# Altium schematic symbol library jlcpcb_2025_04_capacitors_extended_0805.schlib: 3281 symbols (part 15 of 18) (continued)
## GRM21BC71C106KE11L
designator C?  Capacitance: 10uF  (hidden comment: *)
Capacitor, Ceramic (MLCC), 10uF, ±10%, 16V, X7S, ±10%, SMD 0805; Manufacturer: Murata Electronics; Manufacturer Part Number: GRM21BC71C106KE11L; Package Size: 0805; JLCPCB Basic Part: No; JLCPCB Part Number: C162319; Supplier 1: LCSC; Category: Capacitors - MLCC; Supplier Part Number 1: C162319; Tolerance: ±10%; Voltage Rating: 16V; Temperature Coefficient: X7S; RoHS: Yes; ComponentLink1Description: Datasheet; ComponentLink1URL: https://wmsc.lcsc.com/wmsc/upload/file/pdf/v2/lcsc/1810201241_Murata-Electronics-GRM21BC71C106KE11L_C162319.pdf; ComponentLink2Description: JLCPCB Part URL; ComponentLink2URL: https://jlcpcb.com/partdetail/C162319; ComponentLink3Description: LCSC Part URL; ComponentLink3URL: https://lcsc.com/product-detail/Multilayer-Ceramic-Capacitors-MLCC---SMD-SMT_Murata-Electronics-Murata-Electronics-GRM21BC71C106KE11L_C162319.html
footprint CAP-0805 (0805 (2012M) Capacitor)
pins: 1, 2

## GRM21BC71C106ME11L
designator C?  Capacitance: 10uF  (hidden comment: *)
Capacitor, Ceramic (MLCC), 10uF, ±20%, 16V, X7S, ±20%, SMD 0805; Manufacturer: Murata Electronics; Manufacturer Part Number: GRM21BC71C106ME11L; Package Size: 0805; JLCPCB Basic Part: No; JLCPCB Part Number: C710984; Supplier 1: LCSC; Category: Capacitors - MLCC; Supplier Part Number 1: C710984; Tolerance: ±20%; Voltage Rating: 16V; Temperature Coefficient: X7S; RoHS: Yes; ComponentLink1Description: Datasheet; ComponentLink1URL: https://wmsc.lcsc.com/wmsc/upload/file/pdf/v2/lcsc/2210190600_Murata-Electronics-GRM21BC71C106ME11L_C710984.pdf; ComponentLink2Description: JLCPCB Part URL; ComponentLink2URL: https://jlcpcb.com/partdetail/C710984; ComponentLink3Description: LCSC Part URL; ComponentLink3URL: https://lcsc.com/product-detail/Multilayer-Ceramic-Capacitors-MLCC---SMD-SMT_Murata-Electronics-Murata-Electronics-GRM21BC71C106ME11L_C710984.html
footprint CAP-0805 (0805 (2012M) Capacitor)
pins: 1, 2

## GRM21BC71E106KE11L
designator C?  Capacitance: 10uF  (hidden comment: *)
Capacitor, Ceramic (MLCC), 10uF, ±10%, 25V, X7S, ±10%, SMD 0805; Manufacturer: Murata Electronics; Manufacturer Part Number: GRM21BC71E106KE11L; Package Size: 0805; JLCPCB Basic Part: No; JLCPCB Part Number: C109040; Supplier 1: LCSC; Category: Capacitors - MLCC; Supplier Part Number 1: C109040; Tolerance: ±10%; Voltage Rating: 25V; Temperature Coefficient: X7S; RoHS: Yes; ComponentLink1Description: Datasheet; ComponentLink1URL: https://wmsc.lcsc.com/wmsc/upload/file/pdf/v2/lcsc/1912111437_Murata-Electronics-GRM21BC71E106KE11L_C109040.pdf; ComponentLink2Description: JLCPCB Part URL; ComponentLink2URL: https://jlcpcb.com/partdetail/C109040; ComponentLink3Description: LCSC Part URL; ComponentLink3URL: https://lcsc.com/product-detail/Multilayer-Ceramic-Capacitors-MLCC---SMD-SMT_Murata-Electronics-Murata-Electronics-GRM21BC71E106KE11L_C109040.html
footprint CAP-0805 (0805 (2012M) Capacitor)
pins: 1, 2

## GRM21BC71E475KE11L
designator C?  Capacitance: 4.7uF  (hidden comment: *)
Capacitor, Ceramic (MLCC), 4.7uF, ±10%, 25V, X7S, ±10%, SMD 0805; Manufacturer: Murata Electronics; Manufacturer Part Number: GRM21BC71E475KE11L; Package Size: 0805; JLCPCB Basic Part: No; JLCPCB Part Number: C385038; Supplier 1: LCSC; Category: Capacitors - MLCC; Supplier Part Number 1: C385038; Tolerance: ±10%; Voltage Rating: 25V; Temperature Coefficient: X7S; RoHS: Yes; ComponentLink1Description: Datasheet; ComponentLink1URL: https://wmsc.lcsc.com/wmsc/upload/file/pdf/v2/lcsc/2007231102_Murata-Electronics-GRM21BC71E475KE11L_C385038.pdf; ComponentLink2Description: JLCPCB Part URL; ComponentLink2URL: https://jlcpcb.com/partdetail/C385038; ComponentLink3Description: LCSC Part URL; ComponentLink3URL: https://lcsc.com/product-detail/Multilayer-Ceramic-Capacitors-MLCC---SMD-SMT_Murata-Electronics-Murata-Electronics-GRM21BC71E475KE11L_C385038.html
footprint CAP-0805 (0805 (2012M) Capacitor)
pins: 1, 2

## GRM21BC71H475KE11L
designator C?  Capacitance: 4.7uF  (hidden comment: *)
Capacitor, Ceramic (MLCC), 4.7uF, ±10%, 50V, X7S, ±10%, SMD 0805; Manufacturer: Murata Electronics; Manufacturer Part Number: GRM21BC71H475KE11L; Package Size: 0805; JLCPCB Basic Part: No; JLCPCB Part Number: C162320; Supplier 1: LCSC; Category: Capacitors - MLCC; Supplier Part Number 1: C162320; Tolerance: ±10%; Voltage Rating: 50V; Temperature Coefficient: X7S; RoHS: Yes; ComponentLink1Description: Datasheet; ComponentLink1URL: https://wmsc.lcsc.com/wmsc/upload/file/pdf/v2/lcsc/1810221842_Murata-Electronics-GRM21BC71H475KE11L_C162320.pdf; ComponentLink2Description: JLCPCB Part URL; ComponentLink2URL: https://jlcpcb.com/partdetail/C162320; ComponentLink3Description: LCSC Part URL; ComponentLink3URL: https://lcsc.com/product-detail/Multilayer-Ceramic-Capacitors-MLCC---SMD-SMT_Murata-Electronics-Murata-Electronics-GRM21BC71H475KE11L_C162320.html
footprint CAP-0805 (0805 (2012M) Capacitor)
pins: 1, 2

## GRM21BC72A105KE01L
designator C?  Capacitance: 1uF  (hidden comment: *)
Capacitor, Ceramic (MLCC), 1uF, ±10%, 100V, X7S, ±10%, SMD 0805; Manufacturer: Murata Electronics; Manufacturer Part Number: GRM21BC72A105KE01L; Package Size: 0805; JLCPCB Basic Part: No; JLCPCB Part Number: C385039; Supplier 1: LCSC; Category: Capacitors - MLCC; Supplier Part Number 1: C385039; Tolerance: ±10%; Voltage Rating: 100V; Temperature Coefficient: X7S; RoHS: Yes; ComponentLink1Description: Datasheet; ComponentLink1URL: https://wmsc.lcsc.com/wmsc/upload/file/pdf/v2/lcsc/2304140030_Murata-Electronics-GRM21BC72A105KE01L_C385039.pdf; ComponentLink2Description: JLCPCB Part URL; ComponentLink2URL: https://jlcpcb.com/partdetail/C385039; ComponentLink3Description: LCSC Part URL; ComponentLink3URL: https://lcsc.com/product-detail/Multilayer-Ceramic-Capacitors-MLCC---SMD-SMT_Murata-Electronics-Murata-Electronics-GRM21BC72A105KE01L_C385039.html
footprint CAP-0805 (0805 (2012M) Capacitor)
pins: 1, 2

## GRM21BC80E107ME15L
designator C?  Capacitance: 100uF  (hidden comment: *)
Capacitor, Ceramic (MLCC), 100uF, ±20%, 2.5V, X6S, ±20%, SMD 0805; Manufacturer: Murata Electronics; Manufacturer Part Number: GRM21BC80E107ME15L; Package Size: 0805; JLCPCB Basic Part: No; JLCPCB Part Number: C2167924; Supplier 1: LCSC; Category: Capacitors - MLCC; Supplier Part Number 1: C2167924; Tolerance: ±20%; Voltage Rating: 2.5V; Temperature Coefficient: X6S; RoHS: Yes; ComponentLink1Description: Datasheet; ComponentLink1URL: https://wmsc.lcsc.com/wmsc/upload/file/pdf/v2/lcsc/2202040300_Murata-Electronics-GRM21BC80E107ME15L_C2167924.pdf; ComponentLink2Description: JLCPCB Part URL; ComponentLink2URL: https://jlcpcb.com/partdetail/C2167924; ComponentLink3Description: LCSC Part URL; ComponentLink3URL: https://lcsc.com/product-detail/Multilayer-Ceramic-Capacitors-MLCC---SMD-SMT_Murata-Electronics-Murata-Electronics-GRM21BC80E107ME15L_C2167924.html
footprint CAP-0805 (0805 (2012M) Capacitor)
pins: 1, 2

## GRM21BC80G107ME15L
designator C?  Capacitance: 100uF  (hidden comment: *)
Capacitor, Ceramic (MLCC), 100uF, ±20%, 4V, X6S, ±20%, SMD 0805; Manufacturer: Murata Electronics; Manufacturer Part Number: GRM21BC80G107ME15L; Package Size: 0805; JLCPCB Basic Part: No; JLCPCB Part Number: C521075; Supplier 1: LCSC; Category: Capacitors - MLCC; Supplier Part Number 1: C521075; Tolerance: ±20%; Voltage Rating: 4V; Temperature Coefficient: X6S; RoHS: Yes; ComponentLink1Description: Datasheet; ComponentLink1URL: https://wmsc.lcsc.com/wmsc/upload/file/pdf/v2/lcsc/2007231106_Murata-Electronics-GRM21BC80G107ME15L_C521075.pdf; ComponentLink2Description: JLCPCB Part URL; ComponentLink2URL: https://jlcpcb.com/partdetail/C521075; ComponentLink3Description: LCSC Part URL; ComponentLink3URL: https://lcsc.com/product-detail/Multilayer-Ceramic-Capacitors-MLCC---SMD-SMT_Murata-Electronics-Murata-Electronics-GRM21BC80G107ME15L_C521075.html
footprint CAP-0805 (0805 (2012M) Capacitor)
pins: 1, 2

## GRM21BC80G476ME15K
designator C?  Capacitance: 47uF  (hidden comment: *)
Capacitor, Ceramic (MLCC), 47uF, ±20%, 4V, X6S, ±20%, SMD 0805; Manufacturer: Murata Electronics; Manufacturer Part Number: GRM21BC80G476ME15K; Package Size: 0805; JLCPCB Basic Part: No; JLCPCB Part Number: C2929205; Supplier 1: LCSC; Category: Capacitors - MLCC; Supplier Part Number 1: C2929205; Tolerance: ±20%; Voltage Rating: 4V; Temperature Coefficient: X6S; RoHS: Yes; ComponentLink1Description: Datasheet; ComponentLink1URL: https://wmsc.lcsc.com/wmsc/upload/file/pdf/v2/lcsc/2201121400_Murata-Electronics-GRM21BC80G476ME15K_C2929205.pdf; ComponentLink2Description: JLCPCB Part URL; ComponentLink2URL: https://jlcpcb.com/partdetail/C2929205; ComponentLink3Description: LCSC Part URL; ComponentLink3URL: https://lcsc.com/product-detail/Multilayer-Ceramic-Capacitors-MLCC---SMD-SMT_Murata-Electronics-Murata-Electronics-GRM21BC80G476ME15K_C2929205.html
footprint CAP-0805 (0805 (2012M) Capacitor)
pins: 1, 2

## GRM21BC80G476ME15L
designator C?  Capacitance: 47uF  (hidden comment: *)
Capacitor, Ceramic (MLCC), 47uF, ±20%, 4V, X6S, ±20%, SMD 0805; Manufacturer: Murata Electronics; Manufacturer Part Number: GRM21BC80G476ME15L; Package Size: 0805; JLCPCB Basic Part: No; JLCPCB Part Number: C162410; Supplier 1: LCSC; Category: Capacitors - MLCC; Supplier Part Number 1: C162410; Tolerance: ±20%; Voltage Rating: 4V; Temperature Coefficient: X6S; RoHS: Yes; ComponentLink1Description: Datasheet; ComponentLink1URL: https://wmsc.lcsc.com/wmsc/upload/file/pdf/v2/lcsc/1811121121_Murata-Electronics-GRM21BC80G476ME15L_C162410.pdf; ComponentLink2Description: JLCPCB Part URL; ComponentLink2URL: https://jlcpcb.com/partdetail/C162410; ComponentLink3Description: LCSC Part URL; ComponentLink3URL: https://lcsc.com/product-detail/Multilayer-Ceramic-Capacitors-MLCC---SMD-SMT_Murata-Electronics-Murata-Electronics-GRM21BC80G476ME15L_C162410.html
footprint CAP-0805 (0805 (2012M) Capacitor)
pins: 1, 2

## GRM21BC80J106KE19L
designator C?  Capacitance: 10uF  (hidden comment: *)
Capacitor, Ceramic (MLCC), 10uF, ±10%, 6.3V, ±10%, SMD 0805; Manufacturer: Murata Electronics; Manufacturer Part Number: GRM21BC80J106KE19L; Package Size: 0805; JLCPCB Basic Part: No; JLCPCB Part Number: C162411; Supplier 1: LCSC; Category: Capacitors - MLCC; Supplier Part Number 1: C162411; Tolerance: ±10%; Voltage Rating: 6.3V; RoHS: Yes; ComponentLink1Description: Datasheet; ComponentLink1URL: https://wmsc.lcsc.com/wmsc/upload/file/pdf/v2/lcsc/2012231209_Murata-Electronics-GRM21BC80J106KE19L_C162411.pdf; ComponentLink2Description: JLCPCB Part URL; ComponentLink2URL: https://jlcpcb.com/partdetail/C162411; ComponentLink3Description: LCSC Part URL; ComponentLink3URL: https://lcsc.com/product-detail/Multilayer-Ceramic-Capacitors-MLCC---SMD-SMT_Murata-Electronics-Murata-Electronics-GRM21BC80J106KE19L_C162411.html
footprint CAP-0805 (0805 (2012M) Capacitor)
pins: 1, 2

## GRM21BC80J226ME51L
designator C?  Capacitance: 22uF  (hidden comment: *)
Capacitor, Ceramic (MLCC), 22uF, ±20%, 6.3V, X6S, ±20%, SMD 0805; Manufacturer: Murata Electronics; Manufacturer Part Number: GRM21BC80J226ME51L; Package Size: 0805; JLCPCB Basic Part: No; JLCPCB Part Number: C162412; Supplier 1: LCSC; Category: Capacitors - MLCC; Supplier Part Number 1: C162412; Tolerance: ±20%; Voltage Rating: 6.3V; Temperature Coefficient: X6S; RoHS: Yes; ComponentLink1Description: Datasheet; ComponentLink1URL: https://wmsc.lcsc.com/wmsc/upload/file/pdf/v2/lcsc/1912111437_Murata-Electronics-GRM21BC80J226ME51L_C162412.pdf; ComponentLink2Description: JLCPCB Part URL; ComponentLink2URL: https://jlcpcb.com/partdetail/C162412; ComponentLink3Description: LCSC Part URL; ComponentLink3URL: https://lcsc.com/product-detail/Multilayer-Ceramic-Capacitors-MLCC---SMD-SMT_Murata-Electronics-Murata-Electronics-GRM21BC80J226ME51L_C162412.html
footprint CAP-0805 (0805 (2012M) Capacitor)
pins: 1, 2

## GRM21BC81A226ME44L
designator C?  Capacitance: 22uF  (hidden comment: *)
Capacitor, Ceramic (MLCC), 22uF, ±20%, 10V, X6S, ±20%, SMD 0805; Manufacturer: Murata Electronics; Manufacturer Part Number: GRM21BC81A226ME44L; Package Size: 0805; JLCPCB Basic Part: No; JLCPCB Part Number: C385040; Supplier 1: LCSC; Category: Capacitors - MLCC; Supplier Part Number 1: C385040; Tolerance: ±20%; Voltage Rating: 10V; Temperature Coefficient: X6S; RoHS: Yes; ComponentLink1Description: Datasheet; ComponentLink1URL: https://wmsc.lcsc.com/wmsc/upload/file/pdf/v2/lcsc/2009261433_Murata-Electronics-GRM21BC81A226ME44L_C385040.pdf; ComponentLink2Description: JLCPCB Part URL; ComponentLink2URL: https://jlcpcb.com/partdetail/C385040; ComponentLink3Description: LCSC Part URL; ComponentLink3URL: https://lcsc.com/product-detail/Multilayer-Ceramic-Capacitors-MLCC---SMD-SMT_Murata-Electronics-Murata-Electronics-GRM21BC81A226ME44L_C385040.html
footprint CAP-0805 (0805 (2012M) Capacitor)
pins: 1, 2

## GRM21BC81C106KA73L
designator C?  Capacitance: 10uF  (hidden comment: *)
Capacitor, Ceramic (MLCC), 10uF, ±10%, 16V, X6S, ±10%, SMD 0805; Manufacturer: Murata Electronics; Manufacturer Part Number: GRM21BC81C106KA73L; Package Size: 0805; JLCPCB Basic Part: No; JLCPCB Part Number: C162413; Supplier 1: LCSC; Category: Capacitors - MLCC; Supplier Part Number 1: C162413; Tolerance: ±10%; Voltage Rating: 16V; Temperature Coefficient: X6S; RoHS: Yes; ComponentLink1Description: Datasheet; ComponentLink1URL: https://wmsc.lcsc.com/wmsc/upload/file/pdf/v2/lcsc/1810221842_Murata-Electronics-GRM21BC81C106KA73L_C162413.pdf; ComponentLink2Description: JLCPCB Part URL; ComponentLink2URL: https://jlcpcb.com/partdetail/C162413; ComponentLink3Description: LCSC Part URL; ComponentLink3URL: https://lcsc.com/product-detail/Multilayer-Ceramic-Capacitors-MLCC---SMD-SMT_Murata-Electronics-Murata-Electronics-GRM21BC81C106KA73L_C162413.html
footprint CAP-0805 (0805 (2012M) Capacitor)
pins: 1, 2

## GRM21BC81C106KE15L
designator C?  Capacitance: 10uF  (hidden comment: *)
Capacitor, Ceramic (MLCC), 10uF, ±10%, 16V, X6S, ±10%, SMD 0805; Manufacturer: Murata Electronics; Manufacturer Part Number: GRM21BC81C106KE15L; Package Size: 0805; JLCPCB Basic Part: No; JLCPCB Part Number: C576490; Supplier 1: LCSC; Category: Capacitors - MLCC; Supplier Part Number 1: C576490; Tolerance: ±10%; Voltage Rating: 16V; Temperature Coefficient: X6S; RoHS: Yes; ComponentLink1Description: Datasheet; ComponentLink1URL: https://wmsc.lcsc.com/wmsc/upload/file/pdf/v2/lcsc/2210192230_Murata-Electronics-GRM21BC81C106KE15L_C576490.pdf; ComponentLink2Description: JLCPCB Part URL; ComponentLink2URL: https://jlcpcb.com/partdetail/C576490; ComponentLink3Description: LCSC Part URL; ComponentLink3URL: https://lcsc.com/product-detail/Multilayer-Ceramic-Capacitors-MLCC---SMD-SMT_Murata-Electronics-Murata-Electronics-GRM21BC81C106KE15L_C576490.html
footprint CAP-0805 (0805 (2012M) Capacitor)
pins: 1, 2

## GRM21BC81C226ME44L
designator C?  Capacitance: 22uF  (hidden comment: *)
Capacitor, Ceramic (MLCC), 22uF, ±20%, 16V, X6S, ±20%, SMD 0805; Manufacturer: Murata Electronics; Manufacturer Part Number: GRM21BC81C226ME44L; Package Size: 0805; JLCPCB Basic Part: No; JLCPCB Part Number: C258782; Supplier 1: LCSC; Category: Capacitors - MLCC; Supplier Part Number 1: C258782; Tolerance: ±20%; Voltage Rating: 16V; Temperature Coefficient: X6S; RoHS: Yes; ComponentLink1Description: Datasheet; ComponentLink1URL: https://wmsc.lcsc.com/wmsc/upload/file/pdf/v2/lcsc/2001180203_Murata-Electronics-GRM21BC81C226ME44L_C258782.pdf; ComponentLink2Description: JLCPCB Part URL; ComponentLink2URL: https://jlcpcb.com/partdetail/C258782; ComponentLink3Description: LCSC Part URL; ComponentLink3URL: https://lcsc.com/product-detail/Multilayer-Ceramic-Capacitors-MLCC---SMD-SMT_Murata-Electronics-Murata-Electronics-GRM21BC81C226ME44L_C258782.html
footprint CAP-0805 (0805 (2012M) Capacitor)
pins: 1, 2

## GRM21BC81E106KE11L
designator C?  Capacitance: 10uF  (hidden comment: *)
Capacitor, Ceramic (MLCC), 10uF, ±10%, 25V, X6S, ±10%, SMD 0805; Manufacturer: Murata Electronics; Manufacturer Part Number: GRM21BC81E106KE11L; Package Size: 0805; JLCPCB Basic Part: No; JLCPCB Part Number: C521073; Supplier 1: LCSC; Category: Capacitors - MLCC; Supplier Part Number 1: C521073; Tolerance: ±10%; Voltage Rating: 25V; Temperature Coefficient: X6S; RoHS: Yes; ComponentLink1Description: Datasheet; ComponentLink1URL: https://wmsc.lcsc.com/wmsc/upload/file/pdf/v2/lcsc/2105241240_Murata-Electronics-GRM21BC81E106KE11L_C521073.pdf; ComponentLink2Description: JLCPCB Part URL; ComponentLink2URL: https://jlcpcb.com/partdetail/C521073; ComponentLink3Description: LCSC Part URL; ComponentLink3URL: https://lcsc.com/product-detail/Multilayer-Ceramic-Capacitors-MLCC---SMD-SMT_Murata-Electronics-Murata-Electronics-GRM21BC81E106KE11L_C521073.html
footprint CAP-0805 (0805 (2012M) Capacitor)
pins: 1, 2

## GRM21BC81E106KE51L
designator C?  Capacitance: 10uF  (hidden comment: *)
Capacitor, Ceramic (MLCC), 10uF, ±10%, 25V, X6S, ±10%, SMD 0805; Manufacturer: Murata Electronics; Manufacturer Part Number: GRM21BC81E106KE51L; Package Size: 0805; JLCPCB Basic Part: No; JLCPCB Part Number: C417144; Supplier 1: LCSC; Category: Capacitors - MLCC; Supplier Part Number 1: C417144; Tolerance: ±10%; Voltage Rating: 25V; Temperature Coefficient: X6S; RoHS: Yes; ComponentLink1Description: Datasheet; ComponentLink1URL: https://wmsc.lcsc.com/wmsc/upload/file/pdf/v2/lcsc/2007231102_Murata-Electronics-GRM21BC81E106KE51L_C417144.pdf; ComponentLink2Description: JLCPCB Part URL; ComponentLink2URL: https://jlcpcb.com/partdetail/C417144; ComponentLink3Description: LCSC Part URL; ComponentLink3URL: https://lcsc.com/product-detail/Multilayer-Ceramic-Capacitors-MLCC---SMD-SMT_Murata-Electronics-Murata-Electronics-GRM21BC81E106KE51L_C417144.html
footprint CAP-0805 (0805 (2012M) Capacitor)
pins: 1, 2

## GRM21BC81E106ME51L
designator C?  Capacitance: 10uF  (hidden comment: *)
Capacitor, Ceramic (MLCC), 10uF, ±20%, 25V, X6S, ±20%, SMD 0805; Manufacturer: Murata Electronics; Manufacturer Part Number: GRM21BC81E106ME51L; Package Size: 0805; JLCPCB Basic Part: No; JLCPCB Part Number: C710989; Supplier 1: LCSC; Category: Capacitors - MLCC; Supplier Part Number 1: C710989; Tolerance: ±20%; Voltage Rating: 25V; Temperature Coefficient: X6S; RoHS: Yes; ComponentLink1Description: Datasheet; ComponentLink1URL: https://wmsc.lcsc.com/wmsc/upload/file/pdf/v2/lcsc/2210190600_Murata-Electronics-GRM21BC81E106ME51L_C710989.pdf; ComponentLink2Description: JLCPCB Part URL; ComponentLink2URL: https://jlcpcb.com/partdetail/C710989; ComponentLink3Description: LCSC Part URL; ComponentLink3URL: https://lcsc.com/product-detail/Multilayer-Ceramic-Capacitors-MLCC---SMD-SMT_Murata-Electronics-Murata-Electronics-GRM21BC81E106ME51L_C710989.html
footprint CAP-0805 (0805 (2012M) Capacitor)
pins: 1, 2

## GRM21BC81H475KE11L
designator C?  Capacitance: 4.7uF  (hidden comment: *)
Capacitor, Ceramic (MLCC), 4.7uF, ±10%, 50V, X6S, ±10%, SMD 0805; Manufacturer: Murata Electronics; Manufacturer Part Number: GRM21BC81H475KE11L; Package Size: 0805; JLCPCB Basic Part: No; JLCPCB Part Number: C237451; Supplier 1: LCSC; Category: Capacitors - MLCC; Supplier Part Number 1: C237451; Tolerance: ±10%; Voltage Rating: 50V; Temperature Coefficient: X6S; RoHS: Yes; ComponentLink1Description: Datasheet; ComponentLink1URL: https://wmsc.lcsc.com/wmsc/upload/file/pdf/v2/lcsc/1912111437_Murata-Electronics-GRM21BC81H475KE11L_C237451.pdf; ComponentLink2Description: JLCPCB Part URL; ComponentLink2URL: https://jlcpcb.com/partdetail/C237451; ComponentLink3Description: LCSC Part URL; ComponentLink3URL: https://lcsc.com/product-detail/Multilayer-Ceramic-Capacitors-MLCC---SMD-SMT_Murata-Electronics-Murata-Electronics-GRM21BC81H475KE11L_C237451.html
footprint CAP-0805 (0805 (2012M) Capacitor)
pins: 1, 2

## GRM21BD70J226ME44L
designator C?  Capacitance: 22uF  (hidden comment: *)
Capacitor, Ceramic (MLCC), 22uF, ±20%, 6.3V, X7T, ±20%, SMD 0805; Manufacturer: Murata Electronics; Manufacturer Part Number: GRM21BD70J226ME44L; Package Size: 0805; JLCPCB Basic Part: No; JLCPCB Part Number: C703098; Supplier 1: LCSC; Category: Capacitors - MLCC; Supplier Part Number 1: C703098; Tolerance: ±20%; Voltage Rating: 6.3V; Temperature Coefficient: X7T; RoHS: Yes; ComponentLink1Description: Datasheet; ComponentLink1URL: https://wmsc.lcsc.com/wmsc/upload/file/pdf/v2/lcsc/2304140030_Murata-Electronics-GRM21BD70J226ME44L_C703098.pdf; ComponentLink2Description: JLCPCB Part URL; ComponentLink2URL: https://jlcpcb.com/partdetail/C703098; ComponentLink3Description: LCSC Part URL; ComponentLink3URL: https://lcsc.com/product-detail/Multilayer-Ceramic-Capacitors-MLCC---SMD-SMT_Murata-Electronics-Murata-Electronics-GRM21BD70J226ME44L_C703098.html
footprint CAP-0805 (0805 (2012M) Capacitor)
pins: 1, 2

## GRM21BD71A226ME44L
designator C?  Capacitance: 22uF  (hidden comment: *)
Capacitor, Ceramic (MLCC), 22uF, ±20%, 10V, X7T, ±20%, SMD 0805; Manufacturer: Murata Electronics; Manufacturer Part Number: GRM21BD71A226ME44L; Package Size: 0805; JLCPCB Basic Part: No; JLCPCB Part Number: C385042; Supplier 1: LCSC; Category: Capacitors - MLCC; Supplier Part Number 1: C385042; Tolerance: ±20%; Voltage Rating: 10V; Temperature Coefficient: X7T; RoHS: Yes; ComponentLink1Description: Datasheet; ComponentLink1URL: https://wmsc.lcsc.com/wmsc/upload/file/pdf/v2/lcsc/2001041604_Murata-Electronics-GRM21BD71A226ME44L_C385042.pdf; ComponentLink2Description: JLCPCB Part URL; ComponentLink2URL: https://jlcpcb.com/partdetail/C385042; ComponentLink3Description: LCSC Part URL; ComponentLink3URL: https://lcsc.com/product-detail/Multilayer-Ceramic-Capacitors-MLCC---SMD-SMT_Murata-Electronics-Murata-Electronics-GRM21BD71A226ME44L_C385042.html
footprint CAP-0805 (0805 (2012M) Capacitor)
pins: 1, 2

## GRM21BD72A225KE01L
designator C?  Capacitance: 2.2uF  (hidden comment: *)
Capacitor, Ceramic (MLCC), 2.2uF, 100V, X7T, SMD 0805; Manufacturer: Murata Electronics; Manufacturer Part Number: GRM21BD72A225KE01L; Package Size: 0805; JLCPCB Basic Part: No; JLCPCB Part Number: C2981733; Supplier 1: LCSC; Category: Capacitors - MLCC; Supplier Part Number 1: C2981733; Voltage Rating: 100V; Temperature Coefficient: X7T; RoHS: Yes; ComponentLink1Description: Datasheet; ComponentLink1URL: https://wmsc.lcsc.com/wmsc/upload/file/pdf/v2/lcsc/2203210916_Murata-Electronics-GRM21BD72A225KE01L_C2981733.pdf; ComponentLink2Description: JLCPCB Part URL; ComponentLink2URL: https://jlcpcb.com/partdetail/C2981733; ComponentLink3Description: LCSC Part URL; ComponentLink3URL: https://lcsc.com/product-detail/Multilayer-Ceramic-Capacitors-MLCC---SMD-SMT_Murata-Electronics-Murata-Electronics-GRM21BD72A225KE01L_C2981733.html
footprint CAP-0805 (0805 (2012M) Capacitor)
pins: 1, 2

## GRM21BE70G226ME51L
designator C?  Capacitance: 22uF  (hidden comment: *)
Capacitor, Ceramic (MLCC), 22uF, ±20%, 4V, X7U, ±20%, SMD 0805; Manufacturer: Murata Electronics; Manufacturer Part Number: GRM21BE70G226ME51L; Package Size: 0805; JLCPCB Basic Part: No; JLCPCB Part Number: C363932; Supplier 1: LCSC; Category: Capacitors - MLCC; Supplier Part Number 1: C363932; Tolerance: ±20%; Voltage Rating: 4V; Temperature Coefficient: X7U; RoHS: Yes; ComponentLink1Description: Datasheet; ComponentLink1URL: https://wmsc.lcsc.com/wmsc/upload/file/pdf/v2/lcsc/2304140030_Murata-Electronics-GRM21BE70G226ME51L_C363932.pdf; ComponentLink2Description: JLCPCB Part URL; ComponentLink2URL: https://jlcpcb.com/partdetail/C363932; ComponentLink3Description: LCSC Part URL; ComponentLink3URL: https://lcsc.com/product-detail/Multilayer-Ceramic-Capacitors-MLCC---SMD-SMT_Murata-Electronics-Murata-Electronics-GRM21BE70G226ME51L_C363932.html
footprint CAP-0805 (0805 (2012M) Capacitor)
pins: 1, 2

## GRM21BR6YA106KE43L
designator C?  Capacitance: 10uF  (hidden comment: *)
Capacitor, Ceramic (MLCC), 10uF, ±10%, 35V, X5R, ±10%, SMD 0805; Manufacturer: Murata Electronics; Manufacturer Part Number: GRM21BR6YA106KE43L; Package Size: 0805; JLCPCB Basic Part: No; JLCPCB Part Number: C162422; Supplier 1: LCSC; Category: Capacitors - MLCC; Supplier Part Number 1: C162422; Tolerance: ±10%; Voltage Rating: 35V; Temperature Coefficient: X5R; RoHS: Yes; ComponentLink1Description: Datasheet; ComponentLink1URL: https://wmsc.lcsc.com/wmsc/upload/file/pdf/v2/lcsc/1810201234_Murata-Electronics-GRM21BR6YA106KE43L_C162422.pdf; ComponentLink2Description: JLCPCB Part URL; ComponentLink2URL: https://jlcpcb.com/partdetail/C162422; ComponentLink3Description: LCSC Part URL; ComponentLink3URL: https://lcsc.com/product-detail/Multilayer-Ceramic-Capacitors-MLCC---SMD-SMT_Murata-Electronics-Murata-Electronics-GRM21BR6YA106KE43L_C162422.html
footprint CAP-0805 (0805 (2012M) Capacitor)
pins: 1, 2

## GRM21BR6YA106ME43L
designator C?  Capacitance: 10uF  (hidden comment: *)
Capacitor, Ceramic (MLCC), 10uF, ±20%, 35V, X5R, ±20%, SMD 0805; Manufacturer: Murata Electronics; Manufacturer Part Number: GRM21BR6YA106ME43L; Package Size: 0805; JLCPCB Basic Part: No; JLCPCB Part Number: C361063; Supplier 1: LCSC; Category: Capacitors - MLCC; Supplier Part Number 1: C361063; Tolerance: ±20%; Voltage Rating: 35V; Temperature Coefficient: X5R; RoHS: Yes; ComponentLink1Description: Datasheet; ComponentLink1URL: https://wmsc.lcsc.com/wmsc/upload/file/pdf/v2/lcsc/1912111437_Murata-Electronics-GRM21BR6YA106ME43L_C361063.pdf; ComponentLink2Description: JLCPCB Part URL; ComponentLink2URL: https://jlcpcb.com/partdetail/C361063; ComponentLink3Description: LCSC Part URL; ComponentLink3URL: https://lcsc.com/product-detail/Multilayer-Ceramic-Capacitors-MLCC---SMD-SMT_Murata-Electronics-Murata-Electronics-GRM21BR6YA106ME43L_C361063.html
footprint CAP-0805 (0805 (2012M) Capacitor)
pins: 1, 2

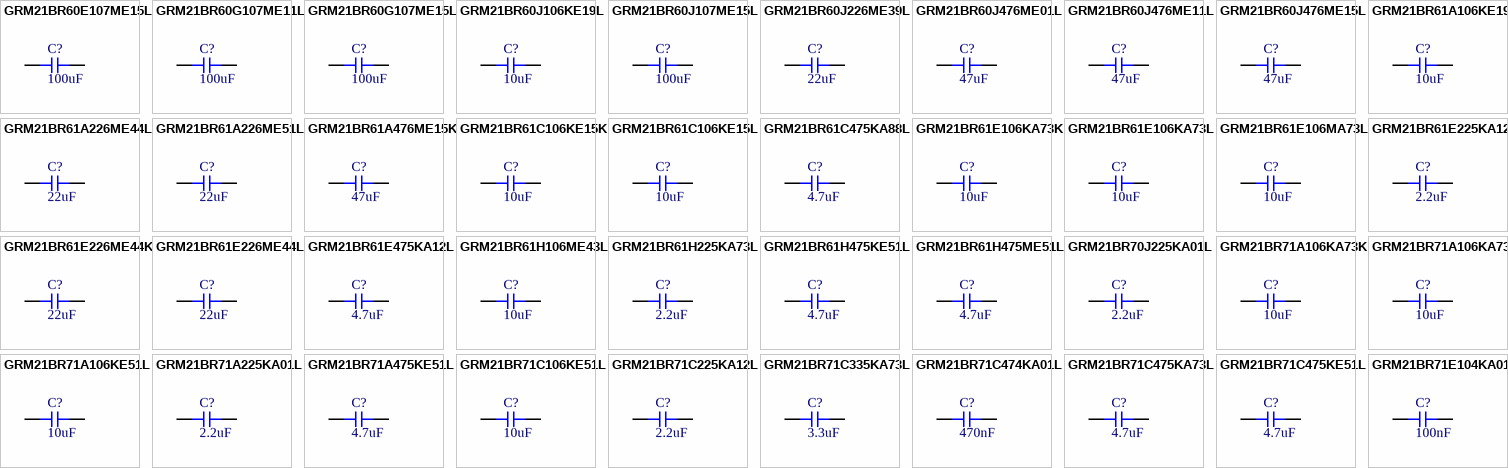
[diagram p66: symbols GRM21BR60E107ME15L to GRM21BR71E104KA01L]

## GRM21BR60E107ME15L
designator C?  Capacitance: 100uF  (hidden comment: *)
Capacitor, Ceramic (MLCC), 100uF, ±20%, 2.5V, X5R, ±20%, SMD 0805; Manufacturer: Murata Electronics; Manufacturer Part Number: GRM21BR60E107ME15L; Package Size: 0805; JLCPCB Basic Part: No; JLCPCB Part Number: C521072; Supplier 1: LCSC; Category: Capacitors - MLCC; Supplier Part Number 1: C521072; Tolerance: ±20%; Voltage Rating: 2.5V; Temperature Coefficient: X5R; RoHS: Yes; ComponentLink1Description: Datasheet; ComponentLink1URL: https://wmsc.lcsc.com/wmsc/upload/file/pdf/v2/lcsc/2007231033_Murata-Electronics-GRM21BR60E107ME15L_C521072.pdf; ComponentLink2Description: JLCPCB Part URL; ComponentLink2URL: https://jlcpcb.com/partdetail/C521072; ComponentLink3Description: LCSC Part URL; ComponentLink3URL: https://lcsc.com/product-detail/Multilayer-Ceramic-Capacitors-MLCC---SMD-SMT_Murata-Electronics-Murata-Electronics-GRM21BR60E107ME15L_C521072.html
footprint CAP-0805 (0805 (2012M) Capacitor)
pins: 1, 2

## GRM21BR60G107ME11L
designator C?  Capacitance: 100uF  (hidden comment: *)
Capacitor, Ceramic (MLCC), 100uF, ±20%, 4V, X5R, ±20%, SMD 0805; Manufacturer: Murata Electronics; Manufacturer Part Number: GRM21BR60G107ME11L; Package Size: 0805; JLCPCB Basic Part: No; JLCPCB Part Number: C710991; Supplier 1: LCSC; Category: Capacitors - MLCC; Supplier Part Number 1: C710991; Tolerance: ±20%; Voltage Rating: 4V; Temperature Coefficient: X5R; RoHS: Yes; ComponentLink1Description: Datasheet; ComponentLink1URL: https://wmsc.lcsc.com/wmsc/upload/file/pdf/v2/lcsc/2104061834_Murata-Electronics-GRM21BR60G107ME11L_C710991.pdf; ComponentLink2Description: JLCPCB Part URL; ComponentLink2URL: https://jlcpcb.com/partdetail/C710991; ComponentLink3Description: LCSC Part URL; ComponentLink3URL: https://lcsc.com/product-detail/Multilayer-Ceramic-Capacitors-MLCC---SMD-SMT_Murata-Electronics-Murata-Electronics-GRM21BR60G107ME11L_C710991.html
footprint CAP-0805 (0805 (2012M) Capacitor)
pins: 1, 2

## GRM21BR60G107ME15L
designator C?  Capacitance: 100uF  (hidden comment: *)
Capacitor, Ceramic (MLCC), 100uF, ±20%, 4V, X5R, ±20%, SMD 0805; Manufacturer: Murata Electronics; Manufacturer Part Number: GRM21BR60G107ME15L; Package Size: 0805; JLCPCB Basic Part: No; JLCPCB Part Number: C437555; Supplier 1: LCSC; Category: Capacitors - MLCC; Supplier Part Number 1: C437555; Tolerance: ±20%; Voltage Rating: 4V; Temperature Coefficient: X5R; RoHS: Yes; ComponentLink1Description: Datasheet; ComponentLink1URL: https://wmsc.lcsc.com/wmsc/upload/file/pdf/v2/lcsc/2304140030_Murata-Electronics-GRM21BR60G107ME15L_C437555.pdf; ComponentLink2Description: JLCPCB Part URL; ComponentLink2URL: https://jlcpcb.com/partdetail/C437555; ComponentLink3Description: LCSC Part URL; ComponentLink3URL: https://lcsc.com/product-detail/Multilayer-Ceramic-Capacitors-MLCC---SMD-SMT_Murata-Electronics-Murata-Electronics-GRM21BR60G107ME15L_C437555.html
footprint CAP-0805 (0805 (2012M) Capacitor)
pins: 1, 2

## GRM21BR60J106KE19L
designator C?  Capacitance: 10uF  (hidden comment: *)
Capacitor, Ceramic (MLCC), 10uF, ±10%, 6.3V, X5R, ±10%, SMD 0805; Manufacturer: Murata Electronics; Manufacturer Part Number: GRM21BR60J106KE19L; Package Size: 0805; JLCPCB Basic Part: No; JLCPCB Part Number: C77070; Supplier 1: LCSC; Category: Capacitors - MLCC; Supplier Part Number 1: C77070; Tolerance: ±10%; Voltage Rating: 6.3V; Temperature Coefficient: X5R; RoHS: Yes; ComponentLink1Description: Datasheet; ComponentLink1URL: https://wmsc.lcsc.com/wmsc/upload/file/pdf/v2/lcsc/2304140030_Murata-Electronics-GRM21BR60J106KE19L_C77070.pdf; ComponentLink2Description: JLCPCB Part URL; ComponentLink2URL: https://jlcpcb.com/partdetail/C77070; ComponentLink3Description: LCSC Part URL; ComponentLink3URL: https://lcsc.com/product-detail/Multilayer-Ceramic-Capacitors-MLCC---SMD-SMT_Murata-Electronics-Murata-Electronics-GRM21BR60J106KE19L_C77070.html
footprint CAP-0805 (0805 (2012M) Capacitor)
pins: 1, 2

## GRM21BR60J107ME15L
designator C?  Capacitance: 100uF  (hidden comment: *)
Capacitor, Ceramic (MLCC), 100uF, ±20%, 6.3V, X5R, ±20%, SMD 0805; Manufacturer: Murata Electronics; Manufacturer Part Number: GRM21BR60J107ME15L; Package Size: 0805; JLCPCB Basic Part: No; JLCPCB Part Number: C141660; Supplier 1: LCSC; Category: Capacitors - MLCC; Supplier Part Number 1: C141660; Tolerance: ±20%; Voltage Rating: 6.3V; Temperature Coefficient: X5R; RoHS: Yes; ComponentLink1Description: Datasheet; ComponentLink1URL: https://wmsc.lcsc.com/wmsc/upload/file/pdf/v2/lcsc/1810201235_Murata-Electronics-GRM21BR60J107ME15L_C141660.pdf; ComponentLink2Description: JLCPCB Part URL; ComponentLink2URL: https://jlcpcb.com/partdetail/C141660; ComponentLink3Description: LCSC Part URL; ComponentLink3URL: https://lcsc.com/product-detail/Multilayer-Ceramic-Capacitors-MLCC---SMD-SMT_Murata-Electronics-Murata-Electronics-GRM21BR60J107ME15L_C141660.html
footprint CAP-0805 (0805 (2012M) Capacitor)
pins: 1, 2

## GRM21BR60J226ME39L
designator C?  Capacitance: 22uF  (hidden comment: *)
Capacitor, Ceramic (MLCC), 22uF, ±20%, 6.3V, X5R, ±20%, SMD 0805; Manufacturer: Murata Electronics; Manufacturer Part Number: GRM21BR60J226ME39L; Package Size: 0805; JLCPCB Basic Part: No; JLCPCB Part Number: C77071; Supplier 1: LCSC; Category: Capacitors - MLCC; Supplier Part Number 1: C77071; Tolerance: ±20%; Voltage Rating: 6.3V; Temperature Coefficient: X5R; RoHS: Yes; ComponentLink1Description: Datasheet; ComponentLink1URL: https://wmsc.lcsc.com/wmsc/upload/file/pdf/v2/lcsc/2304140030_Murata-Electronics-GRM21BR60J226ME39L_C77071.pdf; ComponentLink2Description: JLCPCB Part URL; ComponentLink2URL: https://jlcpcb.com/partdetail/C77071; ComponentLink3Description: LCSC Part URL; ComponentLink3URL: https://lcsc.com/product-detail/Multilayer-Ceramic-Capacitors-MLCC---SMD-SMT_Murata-Electronics-Murata-Electronics-GRM21BR60J226ME39L_C77071.html
footprint CAP-0805 (0805 (2012M) Capacitor)
pins: 1, 2

## GRM21BR60J476ME01L
designator C?  Capacitance: 47uF  (hidden comment: *)
Capacitor, Ceramic (MLCC), 47uF, ±20%, 6.3V, X5R, ±20%, SMD 0805; Manufacturer: Murata Electronics; Manufacturer Part Number: GRM21BR60J476ME01L; Package Size: 0805; JLCPCB Basic Part: No; JLCPCB Part Number: C385043; Supplier 1: LCSC; Category: Capacitors - MLCC; Supplier Part Number 1: C385043; Tolerance: ±20%; Voltage Rating: 6.3V; Temperature Coefficient: X5R; RoHS: Yes; ComponentLink1Description: Datasheet; ComponentLink1URL: https://wmsc.lcsc.com/wmsc/upload/file/pdf/v2/lcsc/1912111437_Murata-Electronics-GRM21BR60J476ME01L_C385043.pdf; ComponentLink2Description: JLCPCB Part URL; ComponentLink2URL: https://jlcpcb.com/partdetail/C385043; ComponentLink3Description: LCSC Part URL; ComponentLink3URL: https://lcsc.com/product-detail/Multilayer-Ceramic-Capacitors-MLCC---SMD-SMT_Murata-Electronics-Murata-Electronics-GRM21BR60J476ME01L_C385043.html
footprint CAP-0805 (0805 (2012M) Capacitor)
pins: 1, 2

## GRM21BR60J476ME11L
designator C?  Capacitance: 47uF  (hidden comment: *)
Capacitor, Ceramic (MLCC), 47uF, ±20%, 6.3V, X5R, ±20%, SMD 0805; Manufacturer: Murata Electronics; Manufacturer Part Number: GRM21BR60J476ME11L; Package Size: 0805; JLCPCB Basic Part: No; JLCPCB Part Number: C5267391; Supplier 1: LCSC; Category: Capacitors - MLCC; Supplier Part Number 1: C5267391; Tolerance: ±20%; Voltage Rating: 6.3V; Temperature Coefficient: X5R; RoHS: Yes; ComponentLink1Description: Datasheet; ComponentLink1URL: https://wmsc.lcsc.com/wmsc/upload/file/pdf/v2/lcsc/2211161800_Murata-Electronics-GRM21BR60J476ME11L_C5267391.pdf; ComponentLink2Description: JLCPCB Part URL; ComponentLink2URL: https://jlcpcb.com/partdetail/C5267391; ComponentLink3Description: LCSC Part URL; ComponentLink3URL: https://lcsc.com/product-detail/Multilayer-Ceramic-Capacitors-MLCC---SMD-SMT_Murata-Electronics-Murata-Electronics-GRM21BR60J476ME11L_C5267391.html
footprint CAP-0805 (0805 (2012M) Capacitor)
pins: 1, 2

## GRM21BR60J476ME15L
designator C?  Capacitance: 47uF  (hidden comment: *)
Capacitor, Ceramic (MLCC), 47uF, ±20%, 6.3V, X5R, ±20%, SMD 0805; Manufacturer: Murata Electronics; Manufacturer Part Number: GRM21BR60J476ME15L; Package Size: 0805; JLCPCB Basic Part: No; JLCPCB Part Number: C77072; Supplier 1: LCSC; Category: Capacitors - MLCC; Supplier Part Number 1: C77072; Tolerance: ±20%; Voltage Rating: 6.3V; Temperature Coefficient: X5R; RoHS: Yes; ComponentLink1Description: Datasheet; ComponentLink1URL: https://wmsc.lcsc.com/wmsc/upload/file/pdf/v2/lcsc/2304140030_Murata-Electronics-GRM21BR60J476ME15L_C77072.pdf; ComponentLink2Description: JLCPCB Part URL; ComponentLink2URL: https://jlcpcb.com/partdetail/C77072; ComponentLink3Description: LCSC Part URL; ComponentLink3URL: https://lcsc.com/product-detail/Multilayer-Ceramic-Capacitors-MLCC---SMD-SMT_Murata-Electronics-Murata-Electronics-GRM21BR60J476ME15L_C77072.html
footprint CAP-0805 (0805 (2012M) Capacitor)
pins: 1, 2

## GRM21BR61A106KE19L
designator C?  Capacitance: 10uF  (hidden comment: *)
Capacitor, Ceramic (MLCC), 10uF, ±10%, 10V, X5R, ±10%, SMD 0805; Manufacturer: Murata Electronics; Manufacturer Part Number: GRM21BR61A106KE19L; Package Size: 0805; JLCPCB Basic Part: No; JLCPCB Part Number: C77073; Supplier 1: LCSC; Category: Capacitors - MLCC; Supplier Part Number 1: C77073; Tolerance: ±10%; Voltage Rating: 10V; Temperature Coefficient: X5R; RoHS: Yes; ComponentLink1Description: Datasheet; ComponentLink1URL: https://wmsc.lcsc.com/wmsc/upload/file/pdf/v2/lcsc/2304140030_Murata-Electronics-GRM21BR61A106KE19L_C77073.pdf; ComponentLink2Description: JLCPCB Part URL; ComponentLink2URL: https://jlcpcb.com/partdetail/C77073; ComponentLink3Description: LCSC Part URL; ComponentLink3URL: https://lcsc.com/product-detail/Multilayer-Ceramic-Capacitors-MLCC---SMD-SMT_Murata-Electronics-Murata-Electronics-GRM21BR61A106KE19L_C77073.html
footprint CAP-0805 (0805 (2012M) Capacitor)
pins: 1, 2

## GRM21BR61A226ME44L
designator C?  Capacitance: 22uF  (hidden comment: *)
Capacitor, Ceramic (MLCC), 22uF, ±20%, 10V, X5R, ±20%, SMD 0805; Manufacturer: Murata Electronics; Manufacturer Part Number: GRM21BR61A226ME44L; Package Size: 0805; JLCPCB Basic Part: No; JLCPCB Part Number: C441864; Supplier 1: LCSC; Category: Capacitors - MLCC; Supplier Part Number 1: C441864; Tolerance: ±20%; Voltage Rating: 10V; Temperature Coefficient: X5R; RoHS: Yes; ComponentLink1Description: Datasheet; ComponentLink1URL: https://wmsc.lcsc.com/wmsc/upload/file/pdf/v2/lcsc/2304140030_Murata-Electronics-GRM21BR61A226ME44L_C441864.pdf; ComponentLink2Description: JLCPCB Part URL; ComponentLink2URL: https://jlcpcb.com/partdetail/C441864; ComponentLink3Description: LCSC Part URL; ComponentLink3URL: https://lcsc.com/product-detail/Multilayer-Ceramic-Capacitors-MLCC---SMD-SMT_Murata-Electronics-Murata-Electronics-GRM21BR61A226ME44L_C441864.html
footprint CAP-0805 (0805 (2012M) Capacitor)
pins: 1, 2

## GRM21BR61A226ME51L
designator C?  Capacitance: 22uF  (hidden comment: *)
Capacitor, Ceramic (MLCC), 22uF, ±20%, 10V, X5R, ±20%, SMD 0805; Manufacturer: Murata Electronics; Manufacturer Part Number: GRM21BR61A226ME51L; Package Size: 0805; JLCPCB Basic Part: No; JLCPCB Part Number: C77074; Supplier 1: LCSC; Category: Capacitors - MLCC; Supplier Part Number 1: C77074; Tolerance: ±20%; Voltage Rating: 10V; Temperature Coefficient: X5R; RoHS: Yes; ComponentLink1Description: Datasheet; ComponentLink1URL: https://wmsc.lcsc.com/wmsc/upload/file/pdf/v2/lcsc/2304140030_Murata-Electronics-GRM21BR61A226ME51L_C77074.pdf; ComponentLink2Description: JLCPCB Part URL; ComponentLink2URL: https://jlcpcb.com/partdetail/C77074; ComponentLink3Description: LCSC Part URL; ComponentLink3URL: https://lcsc.com/product-detail/Multilayer-Ceramic-Capacitors-MLCC---SMD-SMT_Murata-Electronics-Murata-Electronics-GRM21BR61A226ME51L_C77074.html
footprint CAP-0805 (0805 (2012M) Capacitor)
pins: 1, 2

## GRM21BR61A476ME15K
designator C?  Capacitance: 47uF  (hidden comment: *)
Capacitor, Ceramic (MLCC), 47uF, ±20%, 10V, X5R, ±20%, SMD 0805; Manufacturer: Murata Electronics; Manufacturer Part Number: GRM21BR61A476ME15K; Package Size: 0805; JLCPCB Basic Part: No; JLCPCB Part Number: C2292827; Supplier 1: LCSC; Category: Capacitors - MLCC; Supplier Part Number 1: C2292827; Tolerance: ±20%; Voltage Rating: 10V; Temperature Coefficient: X5R; RoHS: Yes; ComponentLink1Description: Datasheet; ComponentLink1URL: https://wmsc.lcsc.com/wmsc/upload/file/pdf/v2/lcsc/2308111547_Murata-Electronics-GRM21BR61A476ME15K_C2292827.pdf; ComponentLink2Description: JLCPCB Part URL; ComponentLink2URL: https://jlcpcb.com/partdetail/C2292827; ComponentLink3Description: LCSC Part URL; ComponentLink3URL: https://lcsc.com/product-detail/Multilayer-Ceramic-Capacitors-MLCC---SMD-SMT_Murata-Electronics-Murata-Electronics-GRM21BR61A476ME15K_C2292827.html
footprint CAP-0805 (0805 (2012M) Capacitor)
pins: 1, 2

## GRM21BR61C106KE15K
designator C?  Capacitance: 10uF  (hidden comment: *)
Capacitor, Ceramic (MLCC), 10uF, ±10%, 16V, X5R, ±10%, SMD 0805; Manufacturer: Murata Electronics; Manufacturer Part Number: GRM21BR61C106KE15K; Package Size: 0805; JLCPCB Basic Part: No; JLCPCB Part Number: C408141; Supplier 1: LCSC; Category: Capacitors - MLCC; Supplier Part Number 1: C408141; Tolerance: ±10%; Voltage Rating: 16V; Temperature Coefficient: X5R; RoHS: Yes; ComponentLink1Description: Datasheet; ComponentLink1URL: https://wmsc.lcsc.com/wmsc/upload/file/pdf/v2/lcsc/2304140030_Murata-Electronics-GRM21BR61C106KE15K_C408141.pdf; ComponentLink2Description: JLCPCB Part URL; ComponentLink2URL: https://jlcpcb.com/partdetail/C408141; ComponentLink3Description: LCSC Part URL; ComponentLink3URL: https://lcsc.com/product-detail/Multilayer-Ceramic-Capacitors-MLCC---SMD-SMT_Murata-Electronics-Murata-Electronics-GRM21BR61C106KE15K_C408141.html
footprint CAP-0805 (0805 (2012M) Capacitor)
pins: 1, 2

## GRM21BR61C106KE15L
designator C?  Capacitance: 10uF  (hidden comment: *)
Capacitor, Ceramic (MLCC), 10uF, ±10%, 16V, X5R, ±10%, SMD 0805; Manufacturer: Murata Electronics; Manufacturer Part Number: GRM21BR61C106KE15L; Package Size: 0805; JLCPCB Basic Part: No; JLCPCB Part Number: C77075; Supplier 1: LCSC; Category: Capacitors - MLCC; Supplier Part Number 1: C77075; Tolerance: ±10%; Voltage Rating: 16V; Temperature Coefficient: X5R; RoHS: Yes; ComponentLink1Description: Datasheet; ComponentLink1URL: https://wmsc.lcsc.com/wmsc/upload/file/pdf/v2/lcsc/2304140030_Murata-Electronics-GRM21BR61C106KE15L_C77075.pdf; ComponentLink2Description: JLCPCB Part URL; ComponentLink2URL: https://jlcpcb.com/partdetail/C77075; ComponentLink3Description: LCSC Part URL; ComponentLink3URL: https://lcsc.com/product-detail/Multilayer-Ceramic-Capacitors-MLCC---SMD-SMT_Murata-Electronics-Murata-Electronics-GRM21BR61C106KE15L_C77075.html
footprint CAP-0805 (0805 (2012M) Capacitor)
pins: 1, 2

## GRM21BR61C475KA88L
designator C?  Capacitance: 4.7uF  (hidden comment: *)
Capacitor, Ceramic (MLCC), 4.7uF, ±10%, 16V, X5R, ±10%, SMD 0805; Manufacturer: Murata Electronics; Manufacturer Part Number: GRM21BR61C475KA88L; Package Size: 0805; JLCPCB Basic Part: No; JLCPCB Part Number: C97915; Supplier 1: LCSC; Category: Capacitors - MLCC; Supplier Part Number 1: C97915; Tolerance: ±10%; Voltage Rating: 16V; Temperature Coefficient: X5R; RoHS: Yes; ComponentLink1Description: Datasheet; ComponentLink1URL: https://wmsc.lcsc.com/wmsc/upload/file/pdf/v2/lcsc/1804132341_Murata-Electronics-GRM21BR61C475KA88L_C97915.pdf; ComponentLink2Description: JLCPCB Part URL; ComponentLink2URL: https://jlcpcb.com/partdetail/C97915; ComponentLink3Description: LCSC Part URL; ComponentLink3URL: https://lcsc.com/product-detail/Multilayer-Ceramic-Capacitors-MLCC---SMD-SMT_Murata-Electronics-Murata-Electronics-GRM21BR61C475KA88L_C97915.html
footprint CAP-0805 (0805 (2012M) Capacitor)
pins: 1, 2

## GRM21BR61E106KA73K
designator C?  Capacitance: 10uF  (hidden comment: *)
Capacitor, Ceramic (MLCC), 10uF, 25V, X5R, SMD 0805; Manufacturer: Murata Electronics; Manufacturer Part Number: GRM21BR61E106KA73K; Package Size: 0805; JLCPCB Basic Part: No; JLCPCB Part Number: C3909351; Supplier 1: LCSC; Category: Capacitors - MLCC; Supplier Part Number 1: C3909351; Voltage Rating: 25V; Temperature Coefficient: X5R; RoHS: Yes; ComponentLink1Description: Datasheet; ComponentLink1URL: https://wmsc.lcsc.com/wmsc/upload/file/pdf/v2/lcsc/2308111516_Murata-Electronics-GRM21BR61E106KA73K_C3909351.pdf; ComponentLink2Description: JLCPCB Part URL; ComponentLink2URL: https://jlcpcb.com/partdetail/C3909351; ComponentLink3Description: LCSC Part URL; ComponentLink3URL: https://lcsc.com/product-detail/Multilayer-Ceramic-Capacitors-MLCC---SMD-SMT_Murata-Electronics-Murata-Electronics-GRM21BR61E106KA73K_C3909351.html
footprint CAP-0805 (0805 (2012M) Capacitor)
pins: 1, 2

## GRM21BR61E106KA73L
designator C?  Capacitance: 10uF  (hidden comment: *)
Capacitor, Ceramic (MLCC), 10uF, ±10%, 25V, X5R, ±10%, SMD 0805; Manufacturer: Murata Electronics; Manufacturer Part Number: GRM21BR61E106KA73L; Package Size: 0805; JLCPCB Basic Part: No; JLCPCB Part Number: C84416; Supplier 1: LCSC; Category: Capacitors - MLCC; Supplier Part Number 1: C84416; Tolerance: ±10%; Voltage Rating: 25V; Temperature Coefficient: X5R; RoHS: Yes; ComponentLink1Description: Datasheet; ComponentLink1URL: https://wmsc.lcsc.com/wmsc/upload/file/pdf/v2/lcsc/2304140030_Murata-Electronics-GRM21BR61E106KA73L_C84416.pdf; ComponentLink2Description: JLCPCB Part URL; ComponentLink2URL: https://jlcpcb.com/partdetail/C84416; ComponentLink3Description: LCSC Part URL; ComponentLink3URL: https://lcsc.com/product-detail/Multilayer-Ceramic-Capacitors-MLCC---SMD-SMT_Murata-Electronics-Murata-Electronics-GRM21BR61E106KA73L_C84416.html
footprint CAP-0805 (0805 (2012M) Capacitor)
pins: 1, 2
